# Altium footprint library ICs.PcbLib: 151 footprints (part 5 of 10)
Each footprint in its own frame and in the unit in brackets; x right, y up, seen from the top. Pads: shape width x height; smd on the part's side, far side on the other; paste and mask are expansions set on the pad; w line width, h text height; cw(c..) or ccw(c..) is an arc to the next point about the centre after c.
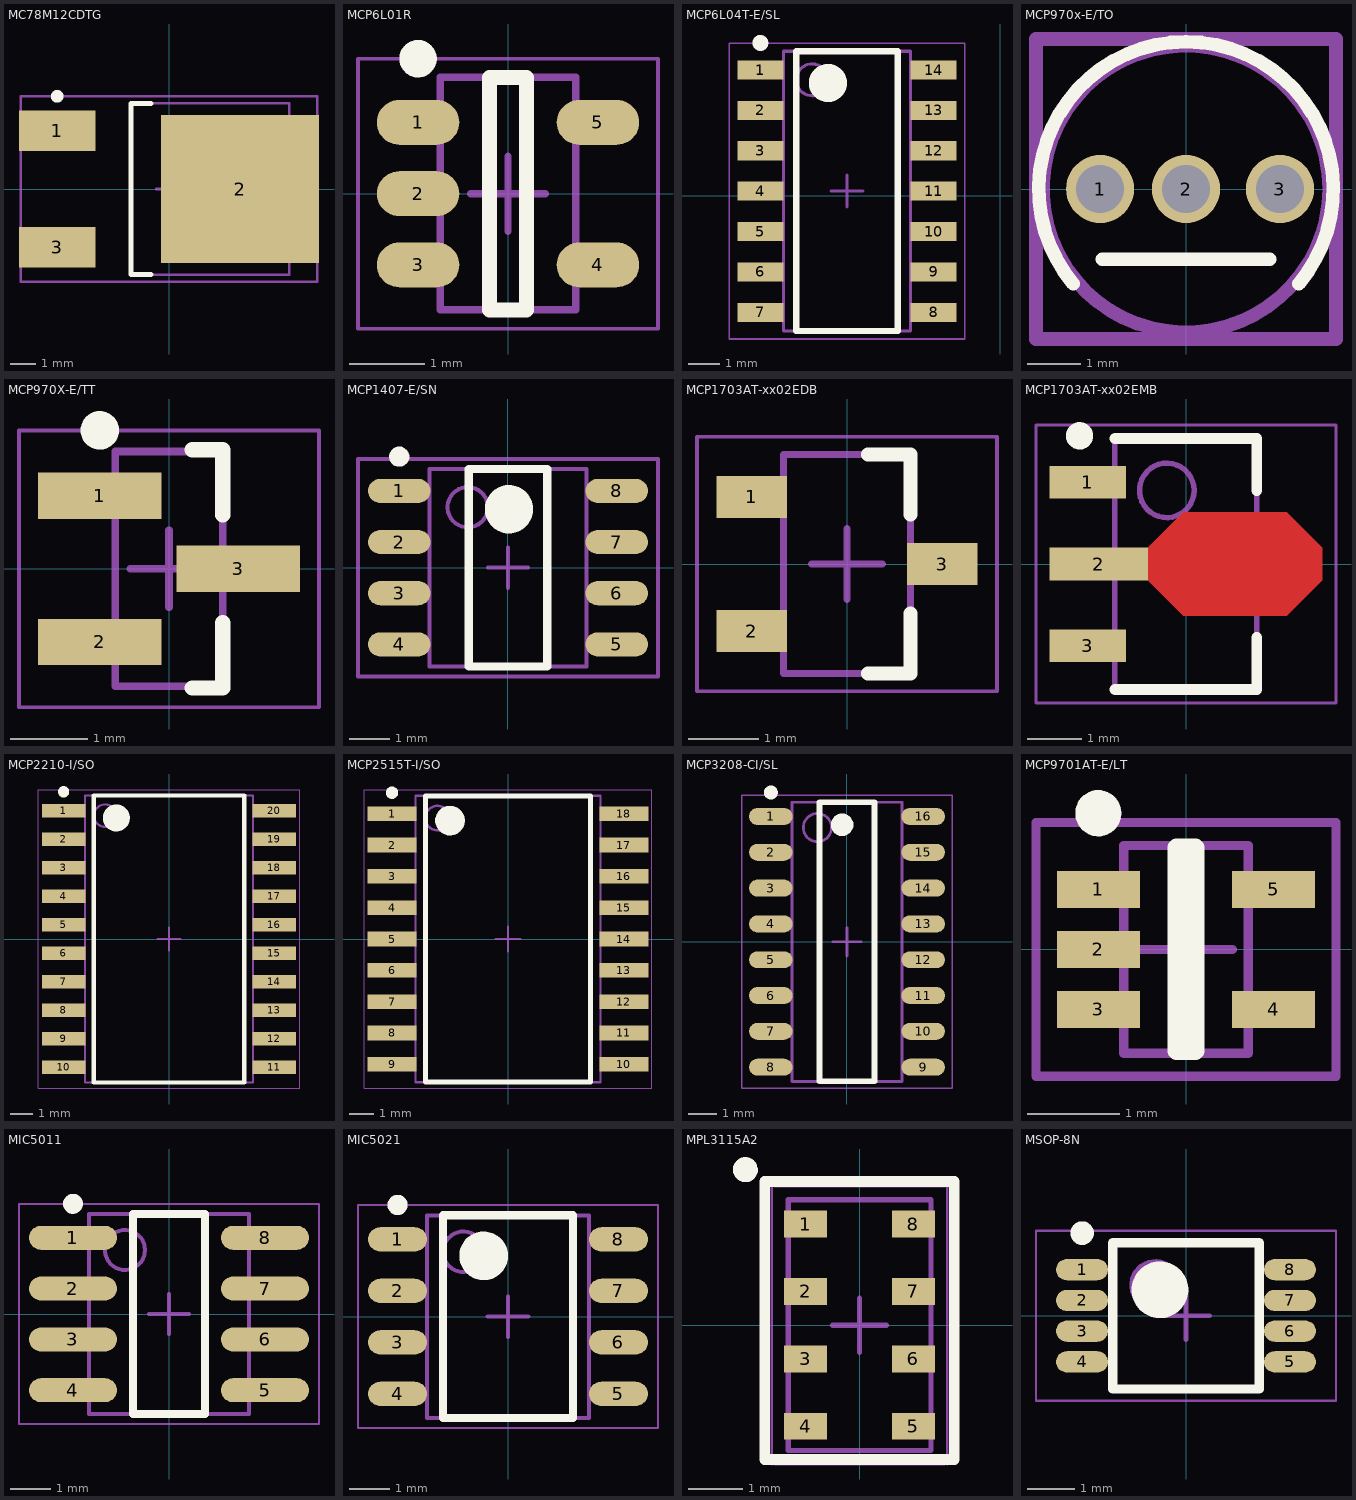
[diagram p4: the footprints below, top view; thin cyan lines are the x and y axes]

## MC78M12CDTG [mm] "IC REG LDO 12V 0.5A DPAK"
height 2.38
pads (3):
  rect 3x1.6 smd: 1(-4.39,2.29) 3(-4.39,-2.29)
  rect 6.2x5.8 smd: 2(2.79,0)
Top Overlay:
  circle w0.25: c-4.39,3.64 r0.125
  lines w0.2: -0.71,-3.35 -1.5,-3.35 -1.5,3.35 -0.71,3.35
Mechanical 13:
  lines w0.1: -1.5,-3.375 -1.5,3.375 4.72,3.375 4.72,-3.375 -1.5,-3.375
Mechanical 15:
  lines w0.1: -0.5,0 0.5,0 ; 0,-0.5 0,0.5 ; -5.825,-3.65 -5.825,3.65 5.825,3.65 5.825,-3.65 -5.825,-3.65
3D body: height 2.38, standoff 0, extent -1.5,-3.375 4.72,3.375

## MCP6L01R [mm] "SOT23, 5-Leads, Body 2.90x2.70mm, Pitch 0.95mm, IPC Medium Density"
height 1.45
pads (5):
  oval 1.1x0.6 smd: 1(-1.2,0.95) 2(-1.2,0) 3(-1.2,-0.95) 4(1.2,-0.95) 5(1.2,0.95)
Top Overlay:
  circle w0.25: c-1.2,1.8 r0.125
  lines w0.2: -0.25,-1.55 0.25,-1.55 0.25,1.55 -0.25,1.55 -0.25,-1.55
Mechanical 13:
  lines w0.1: -0.9,-1.55 -0.9,1.55 0.9,1.55 0.9,-1.55 -0.9,-1.55
Mechanical 15:
  lines w0.05: -2,-1.8 -2,1.8 2,1.8 2,-1.8 -2,-1.8
  lines w0.1: -0.5,0 0.5,0 ; 0,-0.5 0,0.5
3D body: height 1.45, standoff 0, extent -0.9,-1.55 0.9,1.55

## MCP6L04T-E/SL [mm] "IC OPAMP GP 1MHZ RRO 14SOIC"
pads (14):
  rect 1.45x0.6 smd: 1(-7.551,3.962) 2(-7.551,2.692) 3(-7.551,1.422) 4(-7.551,0.152) 5(-7.551,-1.118) 6(-7.551,-2.388) 7(-7.551,-3.658) 8(-2.101,-3.658) 9(-2.101,-2.388) 10(-2.101,-1.118) 11(-2.101,0.152) 12(-2.101,1.422) 13(-2.101,2.692) 14(-2.101,3.962)
Top Overlay:
  circle w0.25: c-7.551,4.812 r0.125
  circle w0.6: c-5.426,3.552 r0.3
  lines w0.2: -6.426,-4.248 -6.426,4.552 -3.226,4.552 -3.226,-4.248 -6.426,-4.248
Mechanical 13:
  circle w0.1: c-5.926,3.652 r0.5
  lines w0.1: -6.826,-4.248 -6.826,4.552 -2.826,4.552 -2.826,-4.248 -6.826,-4.248
Mechanical 15:
  lines w0.05: -8.526,-4.498 -8.526,4.802 -1.126,4.802 -1.126,-4.498 -8.526,-4.498
  lines w0.1: -5.326,0.152 -4.326,0.152 ; -4.826,-0.348 -4.826,0.652
3D body: height 1.75, standoff 0.1, extent -6.826,-4.248 -2.826,4.552

## MCP970x-E/TO [mil] "Low-Power Linear Active Thermistor ICs"
pads (3):
  round 50 hole 35: 1(-62.99,0) 2(0,0) 3(68.9,0)
Top Overlay:
  lines w10: -82.73,-69.42 cw(c0,0) 82.73,-69.42 ; -61.28,-51.42 61.28,-51.42
Mechanical 13:
  circle w10: c0,0 r105
Mechanical 15:
  lines w10: -110,-110 -110,110 110,110 110,-110 -110,-110
3D body: height 208.66, standoff 0, extent -98.68,-92.34 85.63,92.34

## MCP970X-E/TT [mm] "SOT23, 3-Leads, Body 2.86x2.37mm, Pitch 0.95mm, IPC Medium Density"
height 1.12
pads (3):
  rect 1.6x0.6 smd: 1(-0.9,0.95) 2(-0.9,-0.95) 3(0.9,0)
Top Overlay:
  circle w0.25: c-0.9,1.8 r0.125
  lines w0.2: 0.3,-1.55 0.7,-1.55 0.7,-0.7 ; 0.3,1.55 0.7,1.55 0.7,0.7
Mechanical 13:
  lines w0.1: -0.7,-1.525 -0.7,1.525 0.7,1.525 0.7,-1.525 -0.7,-1.525
Mechanical 15:
  lines w0.05: -1.95,-1.8 -1.95,1.8 1.95,1.8 1.95,-1.8 -1.95,-1.8
  lines w0.1: -0.5,0 0.5,0 ; 0,-0.5 0,0.5
3D body: height 1.12, standoff 0.1, extent -0.7,-1.525 0.7,1.525

## MCP1407-E/SN [mm] "Low side FET driver"
height 1.75
pads (8):
  oval 1.55x0.6 smd: 1(-2.7,1.905) 2(-2.7,0.635) 3(-2.7,-0.635) 4(-2.7,-1.905) 5(2.7,-1.905) 6(2.7,-0.635) 7(2.7,0.635) 8(2.7,1.905)
Top Overlay:
  circle w0.6: c0.025,1.45 r0.3
  circle w0.25: c-2.7,2.755 r0.125
  lines w0.2: -0.975,-2.45 0.975,-2.45 0.975,2.45 -0.975,2.45 -0.975,-2.45
Mechanical 13:
  circle w0.1: c-1,1.5 r0.5
  lines w0.1: -1.95,-2.45 1.95,-2.45 1.95,2.45 -1.95,2.45 -1.95,-2.45
Mechanical 15:
  lines w0.1: -0.5,0 0.5,0 ; 0,-0.5 0,0.5 ; -3.725,-2.7 3.725,-2.7 3.725,2.7 -3.725,2.7 -3.725,-2.7
3D body: height 1.75, standoff 0.1, extent -1.95,-2.45 1.95,2.45

## MCP1703AT-xx02EDB [mm] "SOT23, 3-Leads, Body 2.90x2.55mm, Pitch 0.95mm, IPC Medium Density"
height 1.45
pads (3):
  rect 1x0.6 smd: 1(-1.35,0.95) 2(-1.35,-0.95) 3(1.35,0)
Top Overlay:
  lines w0.2: 0.3,-1.55 0.9,-1.55 0.9,-0.7 ; 0.3,1.55 0.9,1.55 0.9,0.7
Mechanical 13:
  lines w0.1: -0.9,-1.55 -0.9,1.55 0.9,1.55 0.9,-1.55 -0.9,-1.55
Mechanical 15:
  lines w0.05: -2.125,-1.8 -2.125,1.8 2.125,1.8 2.125,-1.8 -2.125,-1.8
  lines w0.1: -0.5,0 0.5,0 ; 0,-0.5 0,0.5
3D body: height 1.45, standoff 0, extent -0.9,-1.55 0.9,1.55

## MCP1703AT-xx02EMB [mm] "SOT89, 3-Leads, Body 4.49x2.45mm, Pitch 1.50mm, Lead Span 4.1mm, IPC Medium Density"
height 1.6
pads (3):
  rect 1.4x0.6 smd: 1(-1.8,1.5) 3(-1.8,-1.5)
  rect 1.8x0.6 smd: 2(-1.6,0)
Top Layer:
  region: -0.7,0.3 -0.05,0.95 1.85,0.95 2.5,0.3 2.5,-0.3 1.85,-0.95 -0.05,-0.95 -0.7,-0.3
Top Overlay:
  circle w0.25: c-1.953,2.35 r0.125
  lines w0.2: -1.302,-2.3 1.298,-2.3 1.298,-1.35 ; -1.302,2.3 1.298,2.3 1.298,1.35
Top Solder:
  region: -0.61,0.406 -0.051,0.965 1.854,0.965 2.515,0.305 2.515,-0.305 1.854,-0.965 -0.051,-0.965 -0.635,-0.381 -0.635,0.33
Mechanical 13:
  circle w0.1: c-0.352,1.35 r0.5
  lines w0.1: -1.302,-2.3 -1.302,2.3 1.298,2.3 1.298,-2.3 -1.302,-2.3
Mechanical 15:
  lines w0.05: -2.75,-2.55 -2.75,2.55 2.75,2.55 2.75,-2.55 -2.75,-2.55
  lines w0.1: -0.503,0 0.497,0 ; -0.002,-0.5 -0.002,0.5
3D body: height 1.6, standoff 0, extent -1.302,-2.3 1.298,2.3

## MCP2210-I/SO [mm] "IC CONVERTER USB-SPI 20-SOIC"
height 2.65
pads (20):
  rect 1.95x0.6 smd: 1(-4.7,5.715) 2(-4.7,4.445) 3(-4.7,3.175) 4(-4.7,1.905) 5(-4.7,0.635) 6(-4.7,-0.635) 7(-4.7,-1.905) 8(-4.7,-3.175) 9(-4.7,-4.445) 10(-4.7,-5.715) 11(4.7,-5.715) 12(4.7,-4.445) 13(4.7,-3.175) 14(4.7,-1.905) 15(4.7,-0.635) 16(4.7,0.635) 17(4.7,1.905) 18(4.7,3.175) 19(4.7,4.445) 20(4.7,5.715)
Top Overlay:
  circle w0.6: c-2.35,5.4 r0.3
  circle w0.25: c-4.7,6.565 r0.125
  lines w0.2: -3.35,-6.4 3.35,-6.4 3.35,6.4 -3.35,6.4 -3.35,-6.4
Mechanical 13:
  circle w0.1: c-2.85,5.5 r0.5
  lines w0.1: -3.75,-6.4 3.75,-6.4 3.75,6.4 -3.75,6.4 -3.75,-6.4
Mechanical 15:
  lines w0.05: -5.825,-6.65 5.825,-6.65 5.825,6.65 -5.825,6.65 -5.825,-6.65
  lines w0.1: -0.5,0 0.5,0 ; 0,-0.5 0,0.5
3D body: height 2.65, standoff 0.1, extent -3.75,-6.4 3.75,6.4

## MCP2515T-I/SO [mm] "IC CAN CONTROLLER W/SPI 18SOIC"
height 2.65
pads (18):
  rect 2x0.6 smd: 1(-4.7,5.08) 2(-4.7,3.81) 3(-4.7,2.54) 4(-4.7,1.27) 5(-4.7,0) 6(-4.7,-1.27) 7(-4.7,-2.54) 8(-4.7,-3.81) 9(-4.7,-5.08) 10(4.7,-5.08) 11(4.7,-3.81) 12(4.7,-2.54) 13(4.7,-1.27) 14(4.7,0) 15(4.7,1.27) 16(4.7,2.54) 17(4.7,3.81) 18(4.7,5.08)
Top Overlay:
  circle w0.6: c-2.35,4.8 r0.3
  circle w0.25: c-4.7,5.93 r0.125
  lines w0.2: -3.35,-5.8 3.35,-5.8 3.35,5.8 -3.35,5.8 -3.35,-5.8
Mechanical 13:
  circle w0.1: c-2.85,4.9 r0.5
  lines w0.1: -3.75,-5.8 3.75,-5.8 3.75,5.8 -3.75,5.8 -3.75,-5.8
Mechanical 15:
  lines w0.05: -5.825,-6.05 5.825,-6.05 5.825,6.05 -5.825,6.05 -5.825,-6.05
  lines w0.1: -0.5,0 0.5,0 ; 0,-0.5 0,0.5
3D body: height 2.65, standoff 0.1, extent -3.75,-5.8 3.75,5.8

## MCP3208-CI/SL [mm] "IC ADC 12BIT 2.7V 8CH SPI 16SOIC"
height 1.75
pads (16):
  oval 1.55x0.6 smd: 1(-2.7,4.445) 2(-2.7,3.175) 3(-2.7,1.905) 4(-2.7,0.635) 5(-2.7,-0.635) 6(-2.7,-1.905) 7(-2.7,-3.175) 8(-2.7,-4.445) 9(2.7,-4.445) 10(2.7,-3.175) 11(2.7,-1.905) 12(2.7,-0.635) 13(2.7,0.635) 14(2.7,1.905) 15(2.7,3.175) 16(2.7,4.445)
Top Overlay:
  circle w0.25: c-2.7,5.295 r0.125
  circle w0.4: c-0.175,4.15 r0.2
  lines w0.2: -0.975,-4.95 -0.975,4.95 0.975,4.95 0.975,-4.95 -0.975,-4.95
Mechanical 13:
  circle w0.1: c-1.05,4.05 r0.5
  lines w0.1: -1.95,-4.95 -1.95,4.95 1.95,4.95 1.95,-4.95 -1.95,-4.95
Mechanical 15:
  lines w0.05: -3.725,-5.2 -3.725,5.2 3.725,5.2 3.725,-5.2 -3.725,-5.2
  lines w0.1: -0.5,0 0.5,0 ; 0,-0.5 0,0.5
3D body: height 1.75, standoff 0.1, extent -1.95,-4.95 1.95,4.95

## MCP9701AT-E/LT [mm] "SOT23, 5-Leads, Body 2.3x2.4mm (max), Pitch 0.65mm, IPC Medium Density"
height 1.1
pads (5):
  rect 0.9x0.4 smd: 1(-0.95,0.65) 2(-0.95,0) 3(-0.95,-0.65) 4(0.95,-0.65) 5(0.95,0.65)
Top Overlay:
  circle w0.25: c-0.95,1.475 r0.125
  lines w0.2: -0.1,-1.1 0.1,-1.1 0.1,1.1 -0.1,1.1 -0.1,-1.1
Mechanical 13:
  lines w0.1: -0.675,-1.125 -0.675,1.125 0.675,1.125 0.675,-1.125 -0.675,-1.125
Mechanical 15:
  lines w0.1: -0.5,0 0.5,0 ; 0,-0.5 0,0.5 ; -1.625,-1.375 -1.625,1.375 1.625,1.375 1.625,-1.375 -1.625,-1.375
3D body: height 1.1, standoff 0, extent -0.675,-1.125 0.675,1.125

## MIC5011 [mm] "SOIC, 8-Leads, Body 4.90x3.90mm, Pitch 1.27mm, IPC Medium Density"
height 1.63
pads (8):
  oval 2.2x0.6 smd: 1(-2.4,1.905) 2(-2.4,0.635) 3(-2.4,-0.635) 4(-2.4,-1.905) 5(2.4,-1.905) 6(2.4,-0.635) 7(2.4,0.635) 8(2.4,1.905)
Top Overlay:
  circle w0.25: c-2.4,2.755 r0.125
  lines w0.2: -0.9,-2.5 0.9,-2.5 0.9,2.5 -0.9,2.5 -0.9,-2.5
Mechanical 13:
  circle w0.1: c-1.1,1.6 r0.5
  lines w0.1: -2,-2.5 2,-2.5 2,2.5 -2,2.5 -2,-2.5
Mechanical 15:
  lines w0.05: -3.75,-2.75 3.75,-2.75 3.75,2.75 -3.75,2.75 -3.75,-2.75
  lines w0.1: -0.5,0 0.5,0 ; 0,-0.5 0,0.5
3D body: height 1.63, standoff 0.1, extent -2,-2.5 2,2.5

## MIC5021 [mm] "SOIC, 8-Leads, Body 4.90x3.90mm, Pitch 1.27mm, IPC Medium Density"
height 1.63
pads (8):
  oval 1.45x0.6 smd: 1(-2.725,1.905) 2(-2.725,0.635) 3(-2.725,-0.635) 4(-2.725,-1.905) 5(2.725,-1.905) 6(2.725,-0.635) 7(2.725,0.635) 8(2.725,1.905)
Top Overlay:
  circle w0.25: c-2.725,2.755 r0.125
  circle w0.6: c-0.6,1.5 r0.3
  lines w0.2: -1.6,-2.5 -1.6,2.5 1.6,2.5 1.6,-2.5 -1.6,-2.5
Mechanical 13:
  circle w0.1: c-1.1,1.6 r0.5
  lines w0.1: -2,-2.5 -2,2.5 2,2.5 2,-2.5 -2,-2.5
Mechanical 15:
  lines w0.05: -3.7,-2.75 -3.7,2.75 3.7,2.75 3.7,-2.75 -3.7,-2.75
  lines w0.1: -0.5,0 0.5,0 ; 0,-0.5 0,0.5
3D body: height 1.63, standoff 0.25, extent -2,-2.5 2,2.5

## MPL3115A2 [mm] "LGA, 8-Leads, Body 2.65x4.65mmx1.20mm, Pitch 1.00mm"
height 1.2
pads (8):
  rect 0.8x0.5 smd: 1(-1,1.875) 2(-1,0.625) 3(-1,-0.625) 4(-1,-1.875) 5(1,-1.875) 6(1,-0.625) 7(1,0.625) 8(1,1.875)
Top Overlay:
  lines w0.2: -1.757,-2.489 -1.757,2.667 ; -1.706,-2.489 1.706,-2.489 ; -1.706,2.667 1.706,2.667 ; 1.757,-2.489 1.757,2.667
  lines w0.254: -2.032,2.946 ccw(c-2.117,2.885) -2.012,2.885
Mechanical 13:
  lines w0.1: -1.325,-2.325 1.325,-2.325 1.325,2.325 -1.325,2.325 -1.325,-2.325
Mechanical 15:
  lines w0.05: -1.626,-2.575 -1.626,2.575 ; -1.575,-2.575 1.575,-2.575 ; -1.575,2.575 1.575,2.575 ; 1.626,-2.575 1.626,2.575
  lines w0.1: -0.5,0 0.5,0 ; 0,-0.5 0,0.5
3D body: height 1.2, standoff 0, extent -1.325,-2.325 1.325,2.325

## MSOP-8N [mm] "LT1767"
height 1.1
pads (8):
  oval 1.1x0.45 smd: 1(-2.2,0.975) 2(-2.2,0.325) 3(-2.2,-0.325) 4(-2.2,-0.975) 5(2.2,-0.975) 6(2.2,-0.325) 7(2.2,0.325) 8(2.2,0.975)
Top Overlay:
  circle w0.25: c-2.2,1.75 r0.125
  circle w0.6: c-0.55,0.55 r0.3
  lines w0.2: -1.55,-1.55 -1.55,1.55 1.55,1.55 1.55,-1.55 -1.55,-1.55
Mechanical 13:
  circle w0.1: c-0.65,0.65 r0.5
  lines w0.1: -1.55,-1.55 -1.55,1.55 1.55,1.55 1.55,-1.55 -1.55,-1.55
Mechanical 15:
  lines w0.05: -3.175,-1.8 -3.175,1.8 3.175,1.8 3.175,-1.8 -3.175,-1.8
  lines w0.1: -0.5,0 0.5,0 ; 0,-0.5 0,0.5
3D body: height 1.1, standoff 0.1, extent -1.55,-1.55 1.55,1.55